# Altium footprint library CRD25DA12N-FMC.PcbLib: 132 footprints (part 1 of 9)
Each footprint in its own frame and in the unit in brackets; x right, y up, seen from the top. Pads: shape width x height; smd on the part's side, far side on the other; paste and mask are expansions set on the pad; w line width, h text height; cw(c..) or ccw(c..) is an arc to the next point about the centre after c.
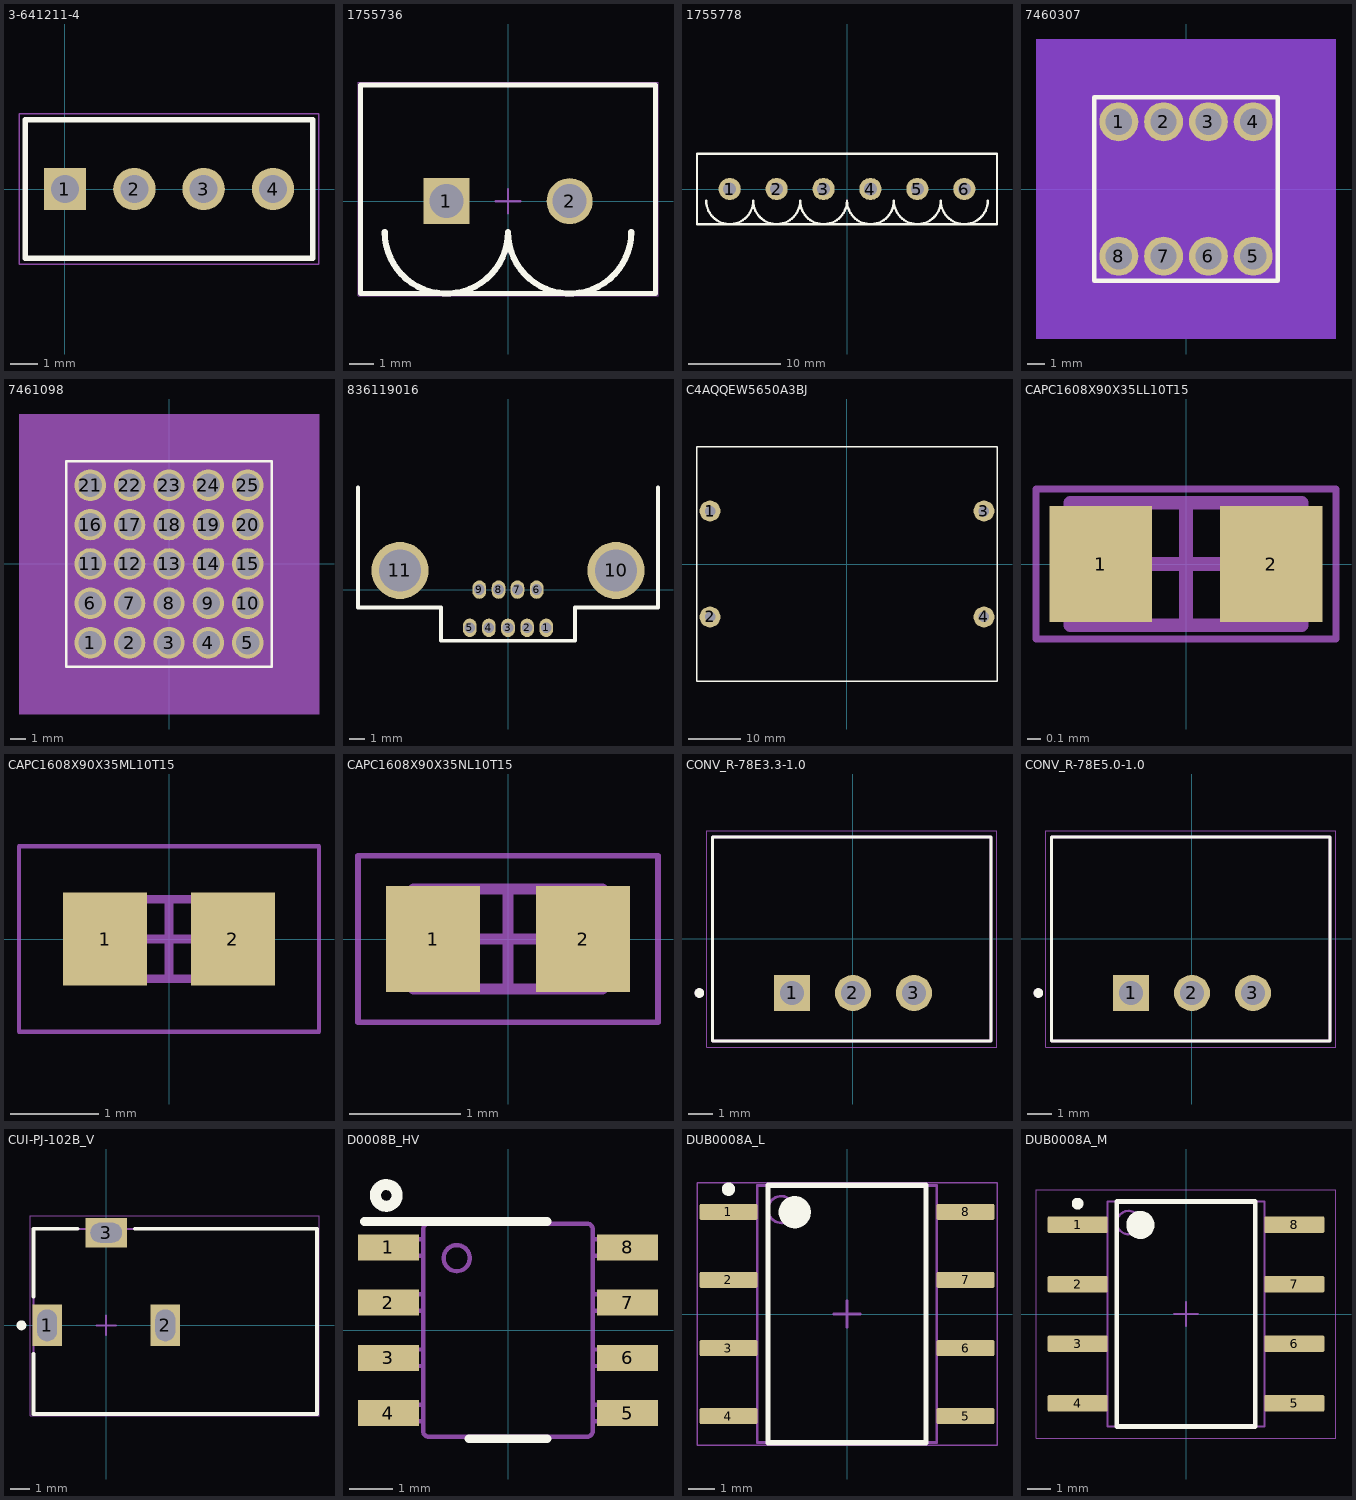
[diagram p0: the footprints below, top view; thin cyan lines are the x and y axes]

## 3-641211-4 [mm] "Connector Header Through Hole 4 position 0.100\" (2.54mm)"
height 10.03
pads (4):
  rect 1.55x1.55 hole 1.02: 1(0,0)
  round 1.55 hole 1.02: 2(2.54,0) 3(5.08,0) 4(7.62,0)
Top Overlay:
  lines w0.2: -1.46,-2.54 9.08,-2.54 9.08,2.54 -1.46,2.54 -1.46,-2.54
Mechanical 13:
  lines w0.1: -1.46,-2.54 9.08,-2.54 9.08,2.54 -1.46,2.54 -1.46,-2.54
Mechanical 15:
  lines w0.05: -1.685,-2.765 9.305,-2.765 9.305,2.765 -1.685,2.765 -1.685,-2.765
3D body "TE 3-641211-4 Color.STEP": height 10.09, standoff -3.5, extent -1.28,-2.54 8.88,2.54

## 1755736 [mm] "THD, 2-Leads, Body 12.16x8.6mm, Pitch 5.08mm"
height 12
pads (2):
  rect 1.9x1.9 hole 1.4: 1(-2.54,0)
  round 1.9 hole 1.4: 2(2.54,0)
Top Overlay:
  lines w0.2: -6.08,-3.81 -6.08,4.79 6.08,4.79 6.08,-3.81 -6.08,-3.81
  lines w0.254: -5.08,-1.27 ccw(c-2.54,-1.27) 0,-1.27 ccw(c2.54,-1.27) 5.08,-1.27
Mechanical 13:
  lines w0.1: -6.08,-3.8 6.08,-3.8 6.08,4.8 -6.08,4.8 -6.08,-3.8
Mechanical 15:
  lines w0.05: -6.18,-3.9 -6.18,4.9 6.18,4.9 6.18,-3.9 -6.18,-3.9
  lines w0.1: -0.5,0 0.5,0 ; 0,-0.5 0,0.5
3D body: height 10, standoff -3.9, extent -3.04,-0.499 -2.044,0.499
3D body: height 10, standoff -3.9, extent 2.04,-0.499 3.036,0.499
3D body: height 12, standoff 4, extent -6.079,-3.799 6.079,4.799
3D body "Phoenix Contact 1755736.stp": height 12, standoff -3.9, extent -6,-3.7 6.16,4.87

## 1755778 [mm] "TERM BLOCK HDR 6POS VERT 5.08MM"
pads (6):
  round 2.4 hole 1.4: 1(-12.7,0) 2(-7.62,0) 3(-2.54,0) 4(2.54,0) 5(7.62,0) 6(12.7,0)
Top Overlay:
  lines w0.254: -15.24,-1.27 ccw(c-12.7,-1.27) -10.16,-1.27 ccw(c-7.62,-1.27) -5.08,-1.27 ccw(c-2.54,-1.27) 0,-1.27 ccw(c2.54,-1.27) 5.08,-1.27 ccw(c7.62,-1.27) 10.16,-1.27 ccw(c12.7,-1.27) 15.24,-1.27 ; -16.24,-3.835 16.24,-3.835 16.24,3.835 -16.24,3.835 -16.24,-3.835
3D body "Phoenix Contact 1755778.stp": height 12, standoff -3.9, extent -16.24,-3.835 16.24,4.765

## 7460307 [mm] "8 Pin Screw Terminal, Power Tap M4 Through Hole"
pads (8):
  round 2.21 hole 1.475: 1(-3.81,3.81) 2(-1.27,3.81) 3(1.27,3.81) 4(3.81,3.81) 5(3.81,-3.81) 6(1.27,-3.81) 7(-1.27,-3.81) 8(-3.81,-3.81)
Top Layer keep-out:
  rectangle: -8.5,-8.5 8.5,8.5
Bottom Layer keep-out:
  rectangle: -8.5,-8.5 8.5,8.5
Top Overlay:
  lines w0.254: -5.2,-5.2 -5.2,5.2 5.2,5.2 5.2,-5.2 -5.2,-5.2
3D body "Wurth 7460307 - Modified.STEP": height 7, standoff -3.5, extent -4.5,-4.5 4.5,4.5

## 7461098 [mil]
pads (25):
  round 80 hole 60 mask+0: 1(-200,-200) 2(-100,-200) 3(0,-200) 4(100,-200) 5(200,-200) 6(-200,-100) 7(-100,-100) 8(0,-100) 9(100,-100) 10(200,-100) 11(-200,0) 12(-100,0) 13(0,0) 14(100,0) 15(200,0) 16(-200,100) 17(-100,100) 18(0,100) 19(100,100) 20(200,100) 21(-200,200) 22(-100,200) 23(0,200) 24(100,200) 25(200,200)
Top Overlay:
  lines w6: -261,-261.09 261,-261.09 261,260.91 -261,260.91 -261,-261.09
Mechanical 5:
  region: -381,380.91 381,380.91 381,-381.09 -381,-381.09
Mechanical 13:
  lines w1: -256,-256.09 256,-256.09 256,255.91 -256,255.91 -256,-256.09
Mechanical 15:
  region: 266,265.91 -266,265.91 -266,-266.09 266,-266.09
  lines w6: -266,-266.09 -266,265.91 266,265.91 266,-266.09 -266,-266.09
3D body: height 10, standoff 0, extent -200,-200 -190,-190
3D body "7461098_Download_STP_7461098_rev1.stp": height 610.24, standoff -137.8, extent -255.91,-255.91 255.91,255.91

## 836119016 [mm]
pads (11):
  oval 0.91x1.218 hole 0.71: 1(2.54,-2.54) 2(1.27,-2.54) 3(0,-2.54) 4(-1.27,-2.54) 5(-2.54,-2.54) 6(1.905,0) 7(0.625,0) 8(-0.625,0) 9(-1.905,0)
  round 3.79 hole 2.79: 10(7.175,1.27) 11(-7.175,1.27)
Top Overlay:
  lines w0.254: -9.965,6.8 -9.965,-1.2 -4.46,-1.2 -4.46,-3.4 4.46,-3.4 4.46,-1.2 9.965,-1.2 9.965,6.8
3D body "Molex 836119016 Color.STEP": height 7.99, standoff -2.61, extent -9.938,-3.491 9.912,11.419

## C4AQQEW5650A3BJ [mm] "CAP FILM 65UF 5% 1.1KVDC RAD"
pads (4):
  round 4 hole 2: 1(-26.25,10.15) 2(-26.25,-10.15) 3(26.25,10.15) 4(26.25,-10.15)
Top Overlay:
  lines w0.254: -28.75,-22.5 28.75,-22.5 28.75,22.5 -28.75,22.5 -28.75,-22.5
3D body "Kemet C4AQQEW5650A3BJ.step": height 65.4, standoff -5.9, extent -29.15,-22.755 29.15,22.75

## CAPC1608X90X35LL10T15 [mm] "Chip Capacitor, 2-Leads, Body 1.60x0.80mm, IPC High Density"
height 0.9
pads (2):
  rect 0.75x0.85 smd: 1(-0.625,0) 2(0.625,0)
Mechanical 13:
  lines w0.1: -0.85,-0.45 -0.85,0.45 0.85,0.45 0.85,-0.45 -0.85,-0.45
Mechanical 15:
  lines w0.05: -1.1,-0.55 -1.1,0.55 1.1,0.55 1.1,-0.55 -1.1,-0.55
  lines w0.1: -0.45,0 0.45,0 ; 0,-0.45 0,0.45
3D body: height 0.9, standoff 0, extent -0.5,-0.45 0.5,0.45
3D body: height 0.9, standoff 0, extent -0.85,-0.45 -0.5,0.45
3D body: height 0.9, standoff 0, extent 0.5,-0.45 0.85,0.45

## CAPC1608X90X35ML10T15 [mm] "Chip Capacitor, 2-Leads, Body 1.60x0.80mm, IPC Low Density"
height 0.9
pads (2):
  rect 0.95x1.05 smd: 1(-0.725,0) 2(0.725,0)
Mechanical 13:
  lines w0.1: -0.85,-0.45 -0.85,0.45 0.85,0.45 0.85,-0.45 -0.85,-0.45
Mechanical 15:
  lines w0.05: -1.7,-1.05 -1.7,1.05 1.7,1.05 1.7,-1.05 -1.7,-1.05
  lines w0.1: -0.45,0 0.45,0 ; 0,-0.45 0,0.45
3D body: height 0.9, standoff 0, extent -0.5,-0.45 0.5,0.45
3D body: height 0.9, standoff 0, extent -0.85,-0.45 -0.5,0.45
3D body: height 0.9, standoff 0, extent 0.5,-0.45 0.85,0.45

## CAPC1608X90X35NL10T15 [mm] "Chip Capacitor, 2-Leads, Body 1.60x0.80mm, IPC Medium Density"
height 0.9
pads (2):
  rect 0.85x0.95 smd: 1(-0.675,0) 2(0.675,0)
Mechanical 13:
  lines w0.1: -0.85,-0.45 0.85,-0.45 0.85,0.45 -0.85,0.45 -0.85,-0.45
Mechanical 15:
  lines w0.05: -1.35,-0.75 1.35,-0.75 1.35,0.75 -1.35,0.75 -1.35,-0.75
  lines w0.1: -0.45,0 0.45,0 ; 0,-0.45 0,0.45
3D body: height 0.9, standoff 0, extent 0.5,-0.45 0.85,0.45
3D body: height 0.9, standoff 0, extent -0.85,-0.45 -0.5,0.45
3D body: height 0.9, standoff 0, extent -0.5,-0.45 0.5,0.45

## CONV_R-78E3.3-1.0 [mm]
pads (3):
  rect 1.508x1.508 hole 1: 1(-2.54,-2.25)
  round 1.508 hole 1: 2(0,-2.25) 3(2.54,-2.25)
Top Overlay:
  circle w0.2: c-6.4,-2.25 r0.1
  lines w0.127: -5.85,-4.25 -5.85,4.25 5.75,4.25 5.75,-4.25 -5.85,-4.25
Top Designator:
  text ".Designator" at 7.33,0.508 h1.52
Mechanical 13:
  circle w0.2: c-6.4,-2.25 r0.1
  lines w0.127: -5.85,-4.25 -5.85,4.25 5.75,4.25 5.75,-4.25 -5.85,-4.25
Mechanical 15:
  lines w0.05: -6.1,-4.5 -6.1,4.5 6,4.5 6,-4.5 -6.1,-4.5
3D body "step_temp.STEP": height 9.9, standoff -4.6, extent -5.8,-4.25 5.8,4.25

## CONV_R-78E5.0-1.0 [mm]
pads (3):
  rect 1.508x1.508 hole 1: 1(-2.54,-2.25)
  round 1.508 hole 1: 2(0,-2.25) 3(2.54,-2.25)
Top Overlay:
  circle w0.2: c-6.4,-2.25 r0.1
  lines w0.127: -5.85,-4.25 -5.85,4.25 5.75,4.25 5.75,-4.25 -5.85,-4.25
Top Designator:
  text ".Designator" at 7.33,0.508 h1.52
Mechanical 13:
  circle w0.2: c-6.4,-2.25 r0.1
  lines w0.127: -5.85,-4.25 -5.85,4.25 5.75,4.25 5.75,-4.25 -5.85,-4.25
Mechanical 15:
  lines w0.05: -6.1,-4.5 -6.1,4.5 6,4.5 6,-4.5 -6.1,-4.5
3D body "step_temp.STEP": height 9.9, standoff -4.6, extent -5.8,-4.25 5.8,4.25

## CUI-PJ-102B_V [mm] "THD, 3-Leads, Body 14.4x9mm, Height 11mm"
height 11
pads (3):
  rect 1.5x2.1 hole 1 slot 1.6 at 90 deg: 1(-3,0) 2(3,0)
  rect 2.1x1.5 hole 1 slot 1.6 at 0 deg: 3(0,4.7)
Top Overlay:
  circle w0.25: c-4.3,0 r0.125
  lines w0.2: -3.7,-1.45 -3.7,-4.5 10.7,-4.5 10.7,4.9 1.45,4.9 ; -3.7,1.45 -3.7,4.9 -1.45,4.9
Mechanical 13:
  lines w0.1: -3.7,-4.5 10.7,-4.5 10.7,4.9 -3.7,4.9 -3.7,-4.5
Mechanical 15:
  lines w0.05: -3.85,-4.6 10.8,-4.6 10.8,5.55 -3.85,5.55 -3.85,-4.6
  lines w0.1: -0.5,0 0.5,0 ; 0,-0.5 0,0.5
3D body "pj-102b.stp": height 11, standoff -3.5, extent -3.7,-4.5 10.7,4.9

## D0008B_HV [mm]
pads (8):
  rect 1.4x0.6 smd paste+0 mask+0: 1(-2.75,1.905) 2(-2.75,0.635) 3(-2.75,-0.635) 4(-2.75,-1.905) 5(2.75,-1.905) 6(2.75,-0.635) 7(2.75,0.635) 8(2.75,1.905)
Top Overlay:
  circle w0.254: c-2.8,3.1 r0.25
  lines w0.2: -3.3,2.5 0.9,2.5 ; -0.9,-2.5 0.9,-2.5
Mechanical 13:
  lines w0.1: -2.375,-2.095 -1.995,-2.095 -1.952,-2.095 -1.952,-1.715 -1.995,-1.715 -2.375,-1.715 ; -2.375,-2.095 -2.589,-2.095 -3.002,-2.095 -3.002,-1.715 -2.589,-1.715 -2.375,-1.715 ; -2.375,-2.095 -2.375,-1.715 ; -2.375,-0.825 -1.995,-0.825 -1.952,-0.825 -1.952,-0.445 -1.995,-0.445 -2.375,-0.445 ; -2.375,-0.825 -2.589,-0.825 -3.002,-0.825 -3.002,-0.445 -2.589,-0.445 -2.375,-0.445 ; -2.375,-0.825 -2.375,-0.445 ; -2.375,0.445 -1.995,0.445 -1.952,0.445 -1.952,0.825 -1.995,0.825 -2.375,0.825 ; -2.375,0.445 -2.589,0.445 -3.002,0.445 -3.002,0.825 -2.589,0.825 -2.375,0.825 ; -2.375,0.445 -2.375,0.825 ; -2.375,1.715 -1.995,1.715 -1.952,1.715 -1.952,2.095 -1.995,2.095 -2.375,2.095 ; -2.375,1.715 -2.589,1.715 -3.002,1.715 -3.002,2.095 -2.589,2.095 -2.375,2.095 ; -2.375,1.715 -2.375,2.095 ; -0.332,-2.45 -1.825,-2.45 -1.826,-2.45 cw(c-1.825,-2.323) -1.952,-2.324 -1.952,-2.323 -1.952,2.323 -1.952,2.324 cw(c-1.825,2.323) -1.826,2.45 -1.825,2.45 -0.332,2.45 ; -0.332,-2.45 -0.182,-2.45 ; -0.332,-2.45 -0.182,-2.45 ; -0.332,2.45 -0.182,2.45 ; -0.332,2.45 -0.182,2.45 ; -0.182,-2.45 0.178,-2.45 ; -0.182,2.45 0.178,2.45 ; 0.178,-2.45 0.328,-2.45 ; 0.178,-2.45 0.328,-2.45 ; 0.178,2.45 0.328,2.45 ; 0.178,2.45 0.328,2.45 ; 0.328,-2.45 1.821,-2.45 1.822,-2.45 ccw(c1.821,-2.323) 1.948,-2.324 1.948,-2.323 1.948,2.323 1.948,2.324 ccw(c1.821,2.323) 1.822,2.45 1.821,2.45 0.328,2.45 ; 2.371,-2.095 2.585,-2.095 2.998,-2.095 2.998,-1.715 2.585,-1.715 2.371,-1.715 ; 2.371,-2.095 1.991,-2.095 1.948,-2.095 1.948,-1.715 1.991,-1.715 2.371,-1.715 ; 2.371,-2.095 2.371,-1.715 ; 2.371,-0.825 2.585,-0.825 2.998,-0.825 2.998,-0.445 2.585,-0.445 2.371,-0.445 ; 2.371,-0.825 1.991,-0.825 1.948,-0.825 1.948,-0.445 1.991,-0.445 2.371,-0.445 ; 2.371,-0.825 2.371,-0.445 ; 2.371,0.445 2.585,0.445 2.998,0.445 2.998,0.825 2.585,0.825 2.371,0.825 ; 2.371,0.445 1.991,0.445 1.948,0.445 1.948,0.825 1.991,0.825 2.371,0.825 ; 2.371,0.445 2.371,0.825 ; 2.371,1.715 2.585,1.715 2.998,1.715 2.998,2.095 2.585,2.095 2.371,2.095 ; 2.371,1.715 1.991,1.715 1.948,1.715 1.948,2.095 1.991,2.095 2.371,2.095 ; 2.371,1.715 2.371,2.095 ; -1.18,1.356 cw(c-1.18,1.656) -1.18,1.956 cw(c-1.18,1.656) -1.18,1.356
3D body: height 0.25, standoff 0, extent 0,0 0.254,0.254
3D body "D0008B.stp": height 1.63, standoff 0, extent -3.011,-2.451 3.011,2.451

## DUB0008A_L [mm] "SOP, 8-Leads, Body 6.7x9.6mm, Pitch 2.54mm, IPC High Density"
height 4.85
pads (8):
  rrect17% 2.15x0.6 smd: 1(-4.425,3.81) 2(-4.425,1.27) 3(-4.425,-1.27) 4(-4.425,-3.81) 5(4.425,-3.81) 6(4.425,-1.27) 7(4.425,1.27) 8(4.425,3.81)
Top Overlay:
  circle w0.6: c-1.95,3.8 r0.3
  circle w0.25: c-4.425,4.66 r0.125
  lines w0.2: -2.95,-4.8 2.95,-4.8 2.95,4.8 -2.95,4.8 -2.95,-4.8
Mechanical 1:
  text ".Designator" at -2.286,-0.381 h1
Mechanical 13:
  circle w0.1: c-2.45,3.9 r0.5
  lines w0.1: -3.35,-4.8 3.35,-4.8 3.35,4.8 -3.35,4.8 -3.35,-4.8
Mechanical 15:
  lines w0.05: -5.6,-4.9 5.6,-4.9 5.6,4.9 -5.6,4.9 -5.6,-4.9
  lines w0.1: -0.5,0 0.5,0 ; 0,-0.5 0,0.5
3D body "DUB0008A.stp": height 4.85, standoff 0, extent -5.242,-4.75 5.242,4.75

## DUB0008A_M [mm] "SOP, 8-Leads, Body 6.7x9.6mm, Pitch 2.54mm, IPC Low Density"
height 4.85
pads (8):
  rrect14% 2.55x0.7 smd: 1(-4.625,3.81) 2(-4.625,1.27) 3(-4.625,-1.27) 4(-4.625,-3.81) 5(4.625,-3.81) 6(4.625,-1.27) 7(4.625,1.27) 8(4.625,3.81)
Top Overlay:
  circle w0.25: c-4.625,4.71 r0.125
  circle w0.6: c-1.95,3.8 r0.3
  lines w0.2: -2.95,-4.8 -2.95,4.8 2.95,4.8 2.95,-4.8 -2.95,-4.8
Mechanical 1:
  text ".Designator" at -2.286,-0.254 h1
Mechanical 13:
  circle w0.1: c-2.45,3.9 r0.5
  lines w0.1: -3.35,-4.8 -3.35,4.8 3.35,4.8 3.35,-4.8 -3.35,-4.8
Mechanical 15:
  lines w0.05: -6.4,-5.3 -6.4,5.3 6.4,5.3 6.4,-5.3 -6.4,-5.3
  lines w0.1: -0.5,0 0.5,0 ; 0,-0.5 0,0.5
3D body "DUB0008A.stp": height 4.85, standoff 0, extent -5.242,-4.75 5.242,4.75